# Altium footprint library IDETEC.PcbLib: 275 footprints (part 1 of 18)
Each footprint in its own frame and in the unit in brackets; x right, y up, seen from the top. Pads: shape width x height; smd on the part's side, far side on the other; paste and mask are expansions set on the pad; w line width, h text height; cw(c..) or ccw(c..) is an arc to the next point about the centre after c.
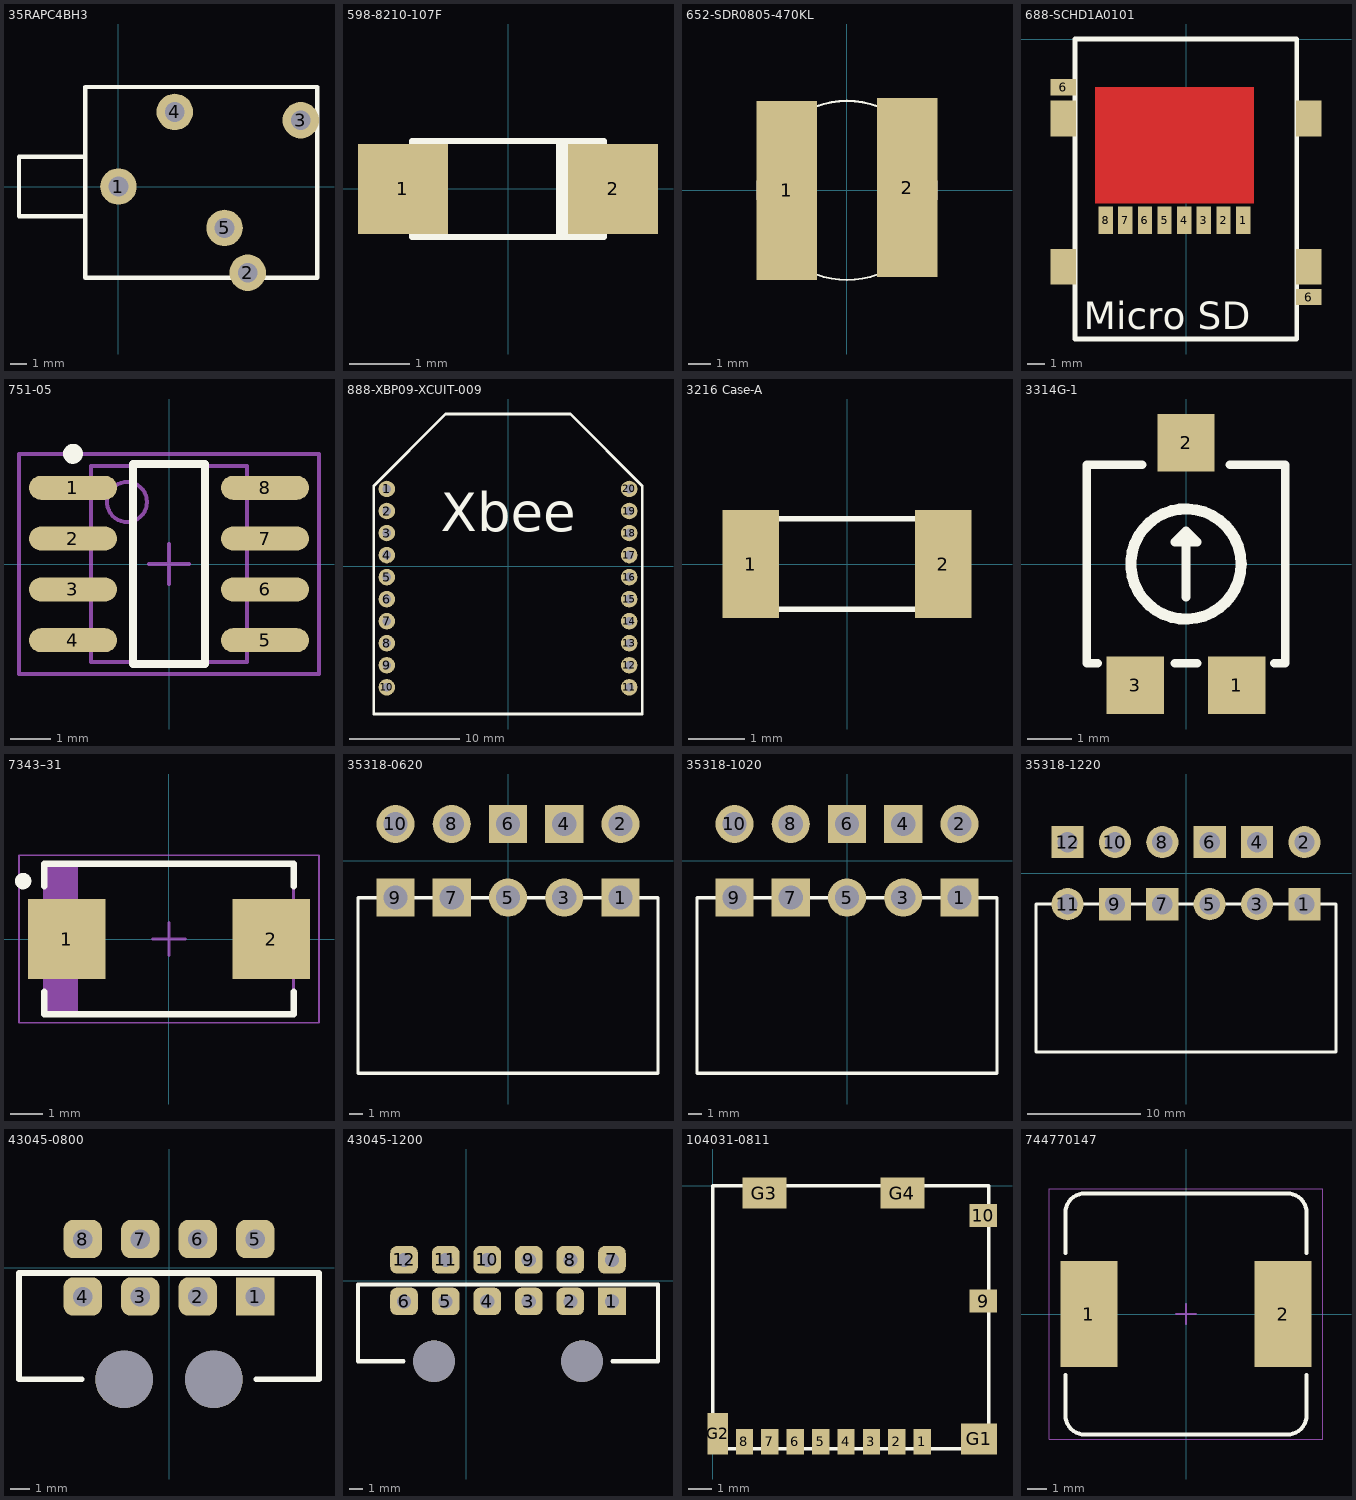
[diagram p0: the footprints below, top view; thin cyan lines are the x and y axes]

## 35RAPC4BH3 [mm] "35RAPC4BH3"
pads (5):
  round 2.2 hole 1.2: 1(0,0) 2(7.8,-5.2) 3(11,4) 4(3.4,4.5) 5(6.4,-2.5)
Top Overlay:
  lines w0.254: -2,-1.8 -6,-1.8 -6,1.8 -2,1.8 ; -2,-5.5 -2,6 12,6 12,-5.5 -2,-5.5
3D body "SW3dPS-STEREO JACK.STEP": height 5, standoff -2, extent -3.745,-5.054 10.755,5.446

## 598-8210-107F [mm] "LED SMD"
height 2
pads (2):
  rect 1.5x1.5 smd: 1(-1.75,0) 2(1.75,0)
Top Overlay:
  rectangle: 0.799,-0.801 1.599,0.799
  lines w0.1: -1.6,-0.8 1.6,-0.8 1.6,0.8 -1.6,0.8 -1.6,-0.8
3D body "LTST-C150GKT.STEP": height 1.1, standoff 0, extent -1.625,-0.825 1.575,0.775

## 652-SDR0805-470KL [mm] "SDR0805-470KL"
pads (2):
  rect 2.7x8 smd: 1(-2.7,0) 2(2.7,0.125)
Top Overlay:
  circle w0.1: c0,0 r4
3D body "User Library-SDR0604.STEP": height 4.55, standoff 0, extent -2.754,-2.79 2.754,2.81

## 688-SCHD1A0101 [mm] "Micro SD"
pads (14):
  rect 0.8x1.524 smd: 1(3.2,-10.15) 2(2.1,-10.15) 3(1,-10.15) 4(-0.1,-10.15) 5(-1.2,-10.15) 6(-2.3,-10.15) 7(-3.4,-10.15) 8(-4.5,-10.15)
  rect 1.45x0.9 smd: 6(-6.875,-2.7) 6(6.875,-14.45)
  rect 1.45x2 smd: ""(-6.875,-12.75) ""(-6.875,-4.45) ""(6.875,-12.75) ""(6.875,-4.45)
Top Layer:
  rectangle: -5.1,-9.2 3.8,-2.7
Top Overlay:
  lines w0.254: -6.215,-16.8 -6.215,0 6.215,0 6.215,-16.8 -6.215,-16.8
  text "Micro SD" at -5.715,-16.256 h1.52

## 751-05 [mm] "SOIC, 8-Leads, Body 4.9x3.9mm, Pitch 1.27mm, IPC Medium Density"
height 1.75
pads (8):
  oval 2.2x0.6 smd: 1(-2.4,1.905) 2(-2.4,0.635) 3(-2.4,-0.635) 4(-2.4,-1.905) 5(2.4,-1.905) 6(2.4,-0.635) 7(2.4,0.635) 8(2.4,1.905)
Top Overlay:
  circle w0.25: c-2.4,2.755 r0.125
  lines w0.2: -0.9,-2.5 0.9,-2.5 0.9,2.5 -0.9,2.5 -0.9,-2.5
Mechanical 13:
  circle w0.1: c-1.05,1.55 r0.5
  lines w0.1: -1.95,-2.45 1.95,-2.45 1.95,2.45 -1.95,2.45 -1.95,-2.45
Mechanical 15:
  lines w0.1: -0.5,0 0.5,0 ; 0,-0.5 0,0.5 ; -3.75,-2.75 3.75,-2.75 3.75,2.75 -3.75,2.75 -3.75,-2.75
3D body "SW3DPS-SO-8-DEFAULT.STEP": height 1.45, standoff 0, extent -2.896,-2.431 2.882,2.471

## 888-XBP09-XCUIT-009 [mm] "XBEE PRO"
height 2
pads (20):
  round 1.5 hole 0.8: 1(-11,7) 2(-11,5) 3(-11,3) 4(-11,1) 5(-11,-1) 6(-11,-3) 7(-11,-5) 8(-11,-7) 9(-11,-9) 10(-11,-11) 11(11,-11) 12(11,-9) 13(11,-7) 14(11,-5) 15(11,-3) 16(11,-1) 17(11,1) 18(11,3) 19(11,5) 20(11,7)
Top Overlay:
  lines w0.254: -12.19,-13.425 -12.19,7.277 -5.662,13.805 5.662,13.805 12.19,7.277 12.19,-13.425 -12.19,-13.425
  text "Xbee" at -6.125,2 h6
3D body "User Library-433Mhz Antenna.STEP": height 89.83, standoff 2.93, extent -4.514,19.466 4.851,52.61
3D body "User Library-XBee-Chip.STEP": height 7.8, standoff 0.3, extent -12.175,-13.025 12.325,14.875
3D body "User Library-PBS2-10-1.STEP": height 4.31, standoff -3.14, extent 10,-12 12,8
3D body "User Library-PBS2-10-1.STEP": height 4.31, standoff -3.14, extent -11.975,-12 -9.975,8
3D body "Johnson Components SMA - 50 Ohm Connectors 142-0701-801.STEP": height 11.6, standoff 3.68, extent -4.668,9.925 4.852,24.195

## 3216 Case-A [mm] "CAP TANT 10UF 6.3V 20% 1206"
height 5
pads (2):
  rect 1x1.9 smd: 1(-1.7,0) 2(1.7,0)
Top Overlay:
  lines w0.1: -1.6,-0.8 1.6,-0.8 1.6,0.8 -1.6,0.8 -1.6,-0.8
3D body "User Library-CAP_TANT_3216-18_A_case-1.STEP": height 1.7, standoff 0, extent -1.7,-0.9 1.7,0.9

## 3314G-1 [mm] "Bourns 3314 - 4 mm Square Trimpot® Trimming Potentiometer"
height 2.55
pads (3):
  rect 1.3x1.3 smd: 1(1.15,-2.75) 2(0,2.75) 3(-1.15,-2.75)
Top Overlay:
  circle w0.254: c0,0 r1.25
  lines w0.2: -2,-2.25 -2.25,-2.25 -2.25,2.25 -1,2.25 ; -0.25,-2.25 0.25,-2.25 ; 0,-0.75 0,0.75 ; 1,2.25 2.25,2.25 2.25,-2.25 2,-2.25 ; 0,0.75 0,0.75 ; 0,0.75 0.25,0.5 -0.25,0.5 0,0.75
3D body "Bourns Trimpot 3314G.STEP": height 2.6, standoff 0, extent -2.4,-3.1 2.4,3.1

## 7343–31 [mm] "Capacitor Tantalium, Case D 7343–31, 2-Leads, Body 7,45x4,45mm, IPC Medium Density"
height 2.8
pads (2):
  rect 2.37x2.43 smd: 1(-3.12,0) 2(3.12,0)
Top Overlay:
  circle w0.25: c-4.45,1.765 r0.125
  lines w0.2: -3.8,-1.615 -3.8,-2.3 3.8,-2.3 3.8,-1.615 ; -3.8,1.615 -3.8,2.3 3.8,2.3 3.8,1.615
Mechanical 13:
  rectangle: -3.8,-2.3 -2.778,2.3
  lines w0.1: -3.8,-2.3 3.8,-2.3 3.8,2.3 -3.8,2.3 -3.8,-2.3
Mechanical 15:
  lines w0.05: -4.575,-2.55 4.575,-2.55 4.575,2.55 -4.575,2.55 -4.575,-2.55
  lines w0.1: -0.5,0 0.5,0 ; 0,-0.5 0,0.5
3D body "User Library-CaseD_7343-31.STEP": height 2.8, standoff 0, extent -3.65,-2.15 3.65,2.15

## 35318-0620 [mm] "4.20mm Pitch Mini-Fit® Header, Dual Row, Right Angle, 12 Circuits, PA Polyamide (Nylon) 6/6 94V-2, White"
height 5
pads (10):
  rect 2.85x2.85 hole 1.8: 1(8.4,-2.75) 4(4.2,2.75) 6(0,2.75) 7(-4.2,-2.75) 9(-8.4,-2.75)
  round 2.85 hole 1.8: 2(8.4,2.75) 3(4.2,-2.75) 5(0,-2.75) 8(-4.2,2.75) 10(-8.4,2.75)
Top Overlay:
  lines w0.254: -11.2,-15.85 11.2,-15.85 11.2,-2.75 -11.2,-2.75 -11.2,-15.85
3D body "353180620.stp": height 11.4, standoff -4, extent -11.072,-16.621 3.128,3.313

## 35318-1020 [mm] "4.20mm Pitch Mini-Fit® Header, Dual Row, Right Angle, 12 Circuits, PA Polyamide (Nylon) 6/6 94V-2, White"
height 5
pads (10):
  rect 2.85x2.85 hole 1.8: 1(8.4,-2.75) 4(4.2,2.75) 6(0,2.75) 7(-4.2,-2.75) 9(-8.4,-2.75)
  round 2.85 hole 1.8: 2(8.4,2.75) 3(4.2,-2.75) 5(0,-2.75) 8(-4.2,2.75) 10(-8.4,2.75)
Top Overlay:
  lines w0.254: -11.2,-15.85 11.2,-15.85 11.2,-2.75 -11.2,-2.75 -11.2,-15.85
3D body "353181020.stp": height 11.4, standoff -4, extent -11.072,-16.621 11.528,3.314

## 35318-1220 [mm] "4.20mm Pitch Mini-Fit® Header, Dual Row, Right Angle, 12 Circuits, PA Polyamide (Nylon) 6/6 94V-2, White"
height 5
pads (12):
  rect 2.85x2.85 hole 1.8: 1(10.5,-2.75) 4(6.3,2.75) 6(2.1,2.75) 7(-2.1,-2.75) 9(-6.3,-2.75) 12(-10.5,2.75)
  round 2.85 hole 1.8: 2(10.5,2.75) 3(6.3,-2.75) 5(2.1,-2.75) 8(-2.1,2.75) 10(-6.3,2.75) 11(-10.5,-2.75)
Top Overlay:
  lines w0.254: -13.3,-15.85 13.3,-15.85 13.3,-2.75 -13.3,-2.75 -13.3,-15.85
3D body "353181220.STEP": height 11.4, standoff -4, extent -13.184,-16.672 13.616,3.263

## 43045-0800 [mm] "Alojamientos de cables y cabecera 8 CKT R/A HEADER"
height 8.77
pads (10):
  rect 2x2 hole 1.02: 1(4.5,-1.5)
  rrect50% 2x2 hole 1.02: 2(1.5,-1.5) 3(-1.5,-1.5) 4(-4.5,-1.5) 5(4.5,1.5) 6(1.5,1.5) 7(-1.5,1.5) 8(-4.5,1.5)
  round 3 hole 3 unplated: ""(-2.34,-5.82) ""(2.34,-5.82)
Top Overlay:
  lines w0.3: -4.552,-5.82 -7.825,-5.82 -7.825,-0.27 7.825,-0.27 7.825,-5.82 4.552,-5.82
3D body "430450800.STEP": height 8.83, standoff -3.12, extent -8.06,-10.4 8.09,1.84

## 43045-1200 [mm] "Alojamientos de cables y cabecera 12 CKT R/A HEADER"
height 8.77
pads (14):
  rect 2x2 hole 1.02: 1(10.5,-1.5)
  rrect50% 2x2 hole 1.02: 2(7.5,-1.5) 3(4.5,-1.5) 4(1.5,-1.5) 5(-1.5,-1.5) 6(-4.5,-1.5) 7(10.5,1.5) 8(7.5,1.5) 9(4.5,1.5) 10(1.5,1.5) 11(-1.5,1.5) 12(-4.5,1.5)
  round 3 hole 3 unplated: ""(-2.34,-5.82) ""(8.34,-5.82)
Top Overlay:
  lines w0.3: -4.552,-5.82 -7.825,-5.82 -7.825,-0.27 13.825,-0.27 13.825,-5.82 10.552,-5.82
3D body "430451200.STEP": height 8.83, standoff -3.12, extent -8.06,-10.4 14.09,1.84

## 104031-0811 [mm] "104031-0811"
pads (14):
  rect 0.75x1.1 smd: 1(9.08,-11.1) 2(7.98,-11.1) 3(6.88,-11.1) 4(5.78,-11.1) 5(4.68,-11.1) 6(3.58,-11.1) 7(2.48,-11.1) 8(1.38,-11.1)
  rect 1.2x1 smd: 9(11.715,-5) 10(11.715,-1.3)
  rect 1.55x1.35 smd: G1(11.54,-10.975)
  rect 0.9x1.8 smd: G2(0.225,-10.75)
  rect 1.9x1.35 smd: G3(2.245,-0.325) G4(8.215,-0.325)
Top Overlay:
  lines w0.15: 0,-11.4 0,0 11.95,0 11.95,-11.4 0,-11.4
3D body "SW3dPS-Micro_SD.STEP": height 1.45, standoff 0.47, extent 0.361,-21.039 11.361,-6.039
3D body "User Library-Micro SD Holder 114-00841-68.STEP": height 1.6, standoff 0, extent 0,-11.6 12,0

## 744770147 [mm] "Inductores fijos WE-PD 1280 47uH 2.7A .1Ohm"
height 8
pads (2):
  rect 2.9x5.4 smd: 1(-4.95,0) 2(4.95,0)
Top Overlay:
  lines w0.2: -6.15,-3.1 -6.15,-5.159 ccw(c-5.159,-5.159) -5.159,-6.15 5.159,-6.15 ccw(c5.159,-5.159) 6.15,-5.159 6.15,-3.1 ; -6.15,3.1 -6.15,5.159 cw(c-5.159,5.159) -5.159,6.15 5.159,6.15 cw(c5.159,5.159) 6.15,5.159 6.15,3.1
Mechanical 15:
  lines w0.05: -6.975,-6.4 6.975,-6.4 6.975,6.4 -6.975,6.4 -6.975,-6.4
  lines w0.1: -0.5,0 0.5,0 ; 0,-0.5 0,0.5
3D body "User Library-DE1207.STEP": height 8, standoff 0, extent -6,-6 6,6